# Altium footprint library Amirreza.PcbLib: 524 footprints (part 9 of 33)
Each footprint in its own frame and in the unit in brackets; x right, y up, seen from the top. Pads: shape width x height; smd on the part's side, far side on the other; paste and mask are expansions set on the pad; w line width, h text height; cw(c..) or ccw(c..) is an arc to the next point about the centre after c.
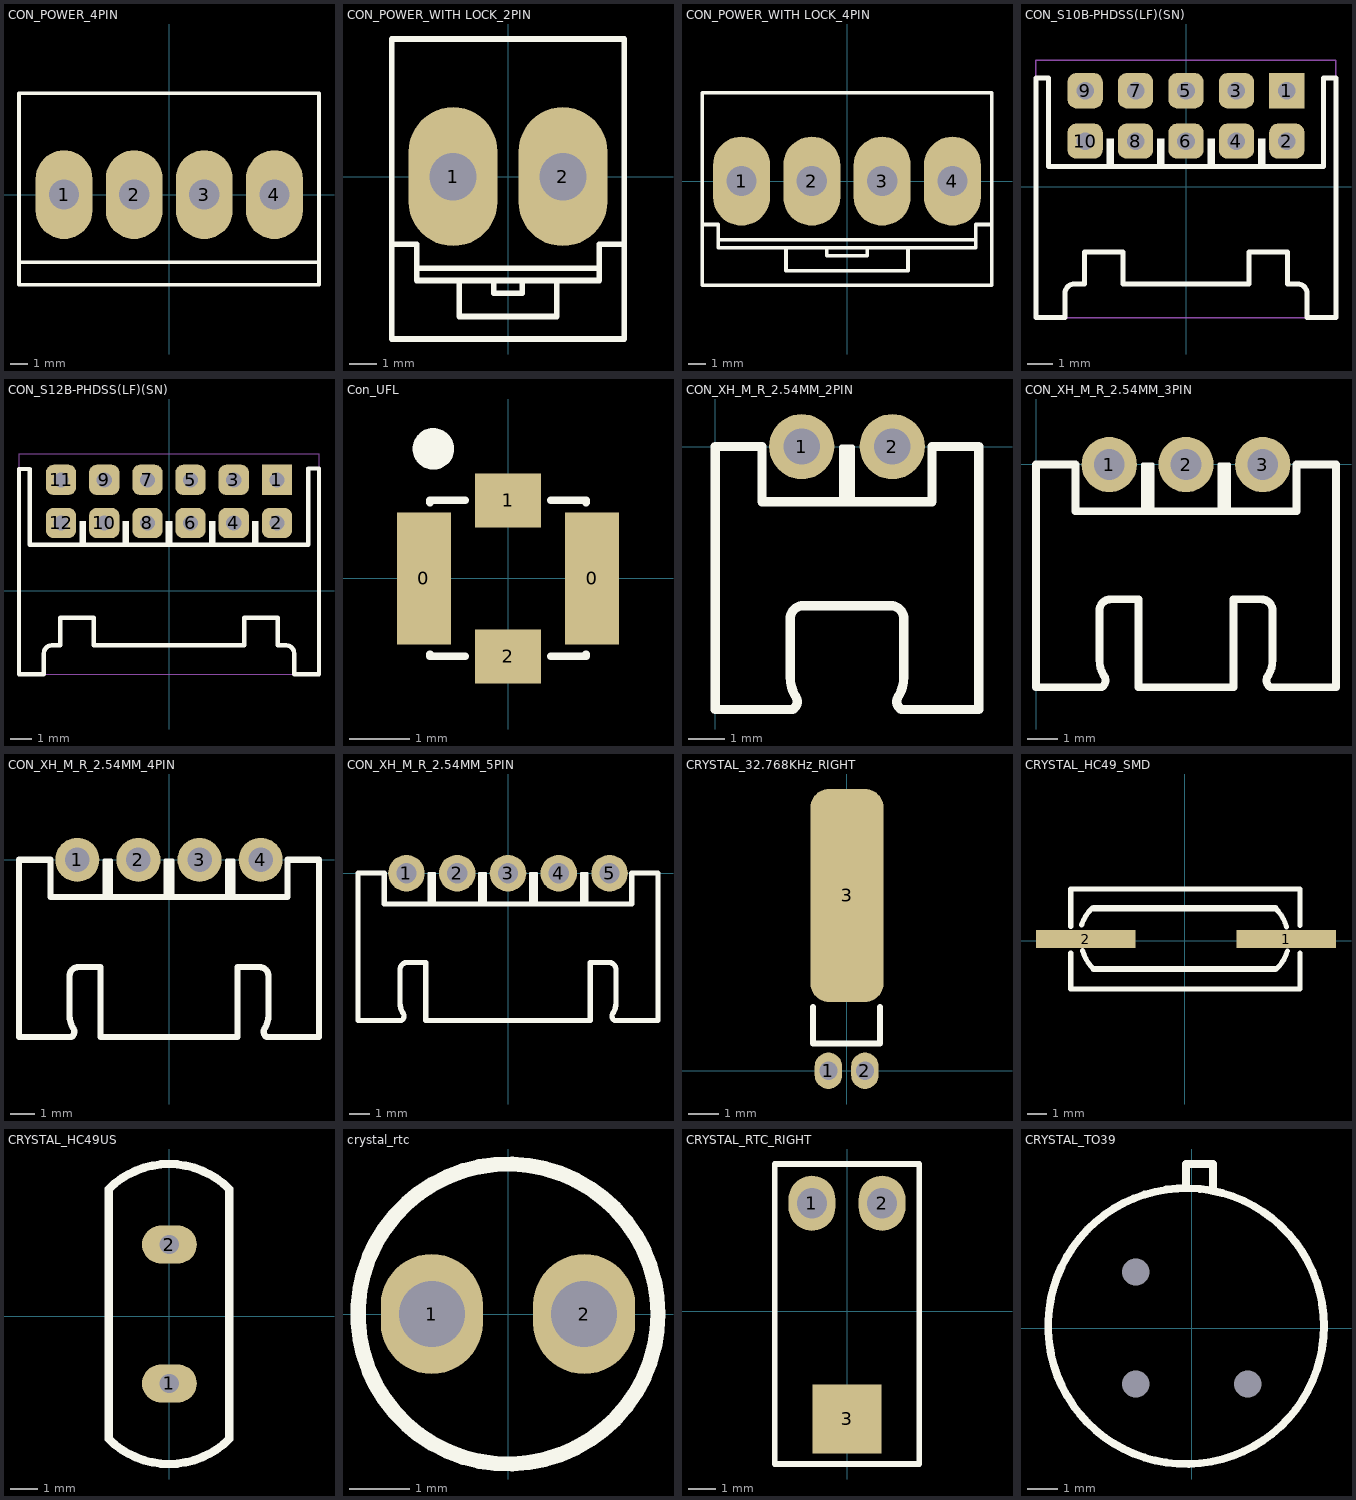
[diagram p8: the footprints below, top view; thin cyan lines are the x and y axes]

## CON_POWER_4PIN [mm]
pads (4):
  oval 3.2x5 hole 1.7: 1(-5.925,0) 2(-1.975,0) 3(1.975,0) 4(5.925,0)
Top Overlay:
  lines w0.203: -8.465,-3.81 8.439,-3.81 ; -8.465,-5.08 8.439,-5.08 8.439,5.715 -8.465,5.715 -8.465,-5.08
3D body "User Library-Cvilux_CI5104P1V00.STEP": height 13.9, standoff -3.6, extent -7.945,-4.978 7.895,4.623

## CON_POWER_WITH LOCK_2PIN [mm]
pads (2):
  oval 3.2x5 hole 1.7: 1(-1.975,0) 2(1.975,0)
Top Overlay:
  lines w0.203: -4.178,-2.436 -3.289,-2.436 -3.289,-3.735 3.289,-3.735 3.289,-2.436 4.178,-2.436 ; -3.289,-3.302 3.289,-3.302 ; -1.752,-3.735 -1.752,-5.035 1.752,-5.035 1.752,-3.735 ; -0.514,-3.735 -0.514,-4.191 0.514,-4.191 0.514,-3.735 ; -4.178,-5.842 4.178,-5.842 4.178,4.953 -4.178,4.953 -4.178,-5.842
3D body "User Library-Power 2 - 3_96 pitch_Straight.step": height 16.61, standoff -3.61, extent -3.945,-5.724 3.975,4.796

## CON_POWER_WITH LOCK_4PIN [mm]
pads (4):
  oval 3.2x5 hole 1.7: 1(-5.925,0) 2(-1.975,0) 3(1.975,0) 4(5.925,0)
Top Overlay:
  lines w0.203: -8.128,-2.436 -7.239,-2.436 -7.239,-3.735 7.239,-3.735 7.239,-2.436 8.128,-2.436 ; -7.239,-3.302 7.239,-3.302 ; -3.429,-3.735 -3.429,-5.035 3.429,-5.035 3.429,-3.735 ; -1.143,-3.735 -1.143,-4.191 1.143,-4.191 1.143,-3.735 ; -8.128,-5.842 8.128,-5.842 8.128,4.953 -8.128,4.953 -8.128,-5.842
3D body "User Library-Power 4 - 3_96 pitch_Straight.step": height 16.58, standoff -3.64, extent -7.92,-5.706 7.92,4.814

## CON_S10B-PHDSS(LF)(SN) [mm]
pads (10):
  rect 1.4x1.4 hole 0.7: 1(3.981,3.818)
  rrect50% 1.4x1.4 hole 0.7: 2(3.981,1.818) 3(1.981,3.818) 4(1.981,1.818) 5(-0.019,3.818) 6(-0.019,1.818) 7(-2.019,3.818) 8(-2.019,1.818) 9(-4.019,3.818) 10(-4.019,1.818)
Top Overlay:
  rectangle: -3.171,0.849 -2.867,1.92
  rectangle: -1.171,0.849 -0.867,1.92
  rectangle: 0.829,0.849 1.133,1.92
  rectangle: 2.829,0.849 3.133,1.92
  lines w0.203: -5.969,-5.182 -5.969,4.318 -5.469,4.318 -5.469,0.818 5.431,0.818 5.431,4.318 5.931,4.318 5.931,-5.182 4.778,-5.182 4.778,-4.217 ccw(c4.413,-4.217) 4.413,-3.852 4.014,-3.852 4.014,-2.582 2.476,-2.582 2.476,-3.852 -2.514,-3.852 -2.514,-2.582 -4.052,-2.582 -4.052,-3.852 -4.451,-3.852 ccw(c-4.451,-4.217) -4.816,-4.217 -4.816,-5.182 -5.969,-5.182
Mechanical 13:
  lines w0.05: -5.969,-5.182 -5.969,5.018 ; -5.969,-5.182 -5.969,5.018 ; -5.969,-5.182 5.931,-5.182 ; -5.969,-5.182 5.931,-5.182 ; -5.969,5.018 5.931,5.018 ; -5.969,5.018 5.931,5.018 ; 5.931,-5.182 5.931,5.018 ; 5.931,-5.182 5.931,5.018
3D body "User Library-JST - S10B-PHDSS (PHD SERIES - 2_0mm PITCH WIRE-TO-BOARD, TH, RA (SIDE ENTRY), GF NYLON).step": height 5.05, standoff -2.95, extent -5.969,-5.207 5.931,4.293

## CON_S12B-PHDSS(LF)(SN) [mm]
pads (12):
  rect 1.4x1.4 hole 0.7: 1(4.984,5.139)
  rrect50% 1.4x1.4 hole 0.7: 2(4.984,3.139) 3(2.984,5.139) 4(2.984,3.139) 5(0.984,5.139) 6(0.984,3.139) 7(-1.016,5.139) 8(-1.016,3.139) 9(-3.016,5.139) 10(-3.016,3.139) 11(-5.016,5.139) 12(-5.016,3.139)
Top Overlay:
  rectangle: -4.168,2.171 -3.864,3.242
  rectangle: -2.168,2.171 -1.864,3.242
  rectangle: -0.168,2.171 0.136,3.242
  rectangle: 3.832,2.171 4.136,3.242
  rectangle: 1.832,2.171 2.136,3.242
  lines w0.203: 6.434,2.139 -6.466,2.139 -6.466,5.639 -6.966,5.639 -6.966,-3.861 -5.813,-3.861 -5.813,-2.896 cw(c-5.448,-2.896) -5.448,-2.53 -5.049,-2.53 -5.049,-1.26 -3.511,-1.26 -3.511,-2.53 3.479,-2.53 3.479,-1.26 5.017,-1.26 5.017,-2.53 5.416,-2.53 cw(c5.416,-2.896) 5.781,-2.896 5.781,-3.861 6.934,-3.861 6.934,5.639 ; 6.434,2.164 6.434,5.664 6.934,5.664
Mechanical 13:
  lines w0.05: 4.934,-3.861 -6.966,-3.861 ; 4.934,6.339 -6.966,6.339 ; -6.966,-3.861 -6.966,6.339 ; -6.966,-3.861 -6.966,6.339 ; -6.966,-3.861 6.934,-3.861 6.934,6.339 -6.966,6.339
3D body "User Library-JST - S10B-PHDSS (PHD SERIES - 2_0mm PITCH WIRE-TO-BOARD, TH, RA (SIDE ENTRY), GF NYLON).step": height 5.05, standoff -2.95, extent -4.966,-3.861 6.934,5.639

## Con_UFL [mm]
pads (4):
  rect 0.9x2.2 smd: 0(-1.4,0) 0(1.4,0)
  rect 1.1x0.9 smd: 1(0,1.3) 2(0,-1.3)
Top Overlay:
  circle w0.35: c-1.245,2.159 r0.17
  lines w0.127: -1.3,-1.264 -1.3,-1.3 -0.716,-1.3 ; -1.3,1.264 -1.3,1.3 -0.716,1.3 ; 0.716,-1.3 1.3,-1.3 1.3,-1.264 ; 0.716,1.3 1.3,1.3 1.3,1.264
3D body "User Library-20279-001.step": height 1.25, standoff -0.01, extent -1.5,-1.55 1.5,1.55

## CON_XH_M_R_2.54MM_2PIN [mm]
pads (2):
  round 1.8 / inner round 1.8 / far side rect 1.8x2.5 hole 1: 1(2.387,-0.003)
  round 1.8 / inner round 1.8 / far side rrect50% 1.8x2.5 hole 1: 2(4.887,-0.003)
Top Overlay:
  rectangle: 3.484,-1.527 3.789,-0.003
  lines w0.127: 3.789,-1.527 3.789,-0.003 3.484,-0.003 ; 3.484,-0.003 3.484,-1.527 3.484,-0.003
  lines w0.254: 7.273,-7.257 5.136,-7.257 cw(c5.263,-7.037) 5.069,-6.873 ccw(c4.189,-6.365) 5.205,-6.365 5.205,-4.757 ccw(c4.84,-4.757) 4.84,-4.392 3.936,-4.392 2.434,-4.392 ccw(c2.434,-4.757) 2.068,-4.757 2.068,-6.365 ccw(c3.084,-6.365) 2.204,-6.873 cw(c2.01,-7.037) 2.137,-7.257 0,-7.257 0,-7.254 0,0 1.289,0 1.289,-1.527 3.789,-1.527 5.984,-1.527 5.984,0 7.273,0 7.273,-7.254
3D body "User Library-JST-XH-2_5mm-2.STEP": height 5.95, standoff -3.35, extent -0.112,-7.256 7.388,0.384

## CON_XH_M_R_2.54MM_3PIN [mm]
pads (3):
  round 1.8 / inner round 1.8 / far side rect 1.8x2.5 hole 1: 1(2.387,-0.003)
  round 1.8 / inner round 1.8 / far side rrect50% 1.8x2.5 hole 1: 2(4.887,-0.003) 3(7.387,-0.003)
Top Overlay:
  rectangle: 3.484,-1.527 3.789,-0.003
  rectangle: 5.984,-1.527 6.289,-0.003
  lines w0.127: 3.484,-1.527 3.484,-0.003 3.789,-0.003 3.789,-1.527 ; 5.984,-1.527 5.984,-0.003 6.289,-0.003 6.289,-1.527
  lines w0.254: 9.773,-7.257 7.636,-7.257 cw(c7.763,-7.037) 7.569,-6.873 ccw(c6.689,-6.365) 7.705,-6.365 7.705,-4.757 ccw(c7.34,-4.757) 7.34,-4.392 6.436,-4.392 6.436,-7.257 3.337,-7.257 3.337,-4.392 2.434,-4.392 ccw(c2.434,-4.757) 2.068,-4.757 2.068,-6.365 ccw(c3.084,-6.365) 2.204,-6.873 cw(c2.01,-7.037) 2.137,-7.257 0,-7.257 0,-7.254 0,0 1.289,0 1.289,-1.527 3.789,-1.527 6.289,-1.527 8.484,-1.527 8.484,0 9.773,0 9.773,-7.254
3D body "User Library-JST-XH-2_5mm-3.STEP": height 5.95, standoff -3.35, extent -0.112,-7.256 9.888,0.384

## CON_XH_M_R_2.54MM_4PIN [mm]
pads (4):
  round 1.8 / inner round 1.8 / far side rect 1.8x2.5 hole 1: 1(-3.75,0)
  round 1.8 / inner round 1.8 / far side rrect50% 1.8x2.5 hole 1: 2(-1.25,0) 3(1.25,0) 4(3.75,0)
Top Overlay:
  rectangle: 2.348,-1.524 2.652,0
  rectangle: -0.152,-1.524 0.152,0
  rectangle: -2.652,-1.524 -2.348,0
  lines w0.127: -2.652,-1.524 -2.652,0 -2.348,0 -2.348,-1.524 ; -0.152,-1.524 -0.152,0 0.152,0 0.152,-1.524 ; 2.348,-1.524 2.348,0 2.652,0 2.652,-1.524
  lines w0.254: -2.348,-1.524 0.152,-1.524 2.652,-1.524 4.848,-1.524 4.848,0.003 6.137,0.003 6.137,-7.251 ; -2.348,-1.524 -4.848,-1.524 -4.848,0.003 -6.137,0.003 -6.137,-7.251 -6.137,-7.254 -4,-7.254 ccw(c-4.127,-7.034) -3.932,-6.871 cw(c-3.053,-6.363) -4.069,-6.363 -4.069,-4.755 cw(c-3.703,-4.755) -3.703,-4.389 -2.8,-4.389 -2.8,-7.254 2.8,-7.254 2.8,-4.389 3.703,-4.389 cw(c3.703,-4.755) 4.069,-4.755 4.069,-6.363 cw(c3.053,-6.363) 3.932,-6.871 ccw(c4.127,-7.034) 4,-7.254 6.137,-7.254
3D body "User Library-JST-XH-2_5mm-4.step": height 5.97, standoff -3.33, extent -6.248,-7.254 6.252,0.386

## CON_XH_M_R_2.54MM_5PIN [mm]
pads (5):
  round 1.8 / inner round 1.8 / far side rect 1.8x2.5 hole 1: 1(-5,0)
  round 1.8 / inner round 1.8 / far side rrect50% 1.8x2.5 hole 1: 2(-2.5,0) 3(0,0) 4(2.5,0) 5(5,0)
Top Overlay:
  rectangle: -3.902,-1.524 -3.598,0
  rectangle: -1.402,-1.524 -1.098,0
  rectangle: 3.598,-1.524 3.902,0
  rectangle: 1.098,-1.524 1.402,0
  lines w0.127: -3.902,-1.524 -3.902,0 -3.598,0 -3.598,-1.524 ; -1.402,-1.524 -1.402,0 -1.098,0 -1.098,-1.524 ; 1.098,-1.524 1.098,0 1.402,0 1.402,-1.524 ; 3.598,-1.524 3.598,0 3.902,0 3.902,-1.524
  lines w0.254: 7.387,-7.254 5.25,-7.254 cw(c5.377,-7.034) 5.182,-6.871 ccw(c4.303,-6.363) 5.319,-6.363 5.319,-4.755 ccw(c4.953,-4.755) 4.953,-4.389 4.05,-4.389 4.05,-7.254 -4.05,-7.254 -4.05,-4.389 -4.953,-4.389 ccw(c-4.953,-4.755) -5.319,-4.755 -5.319,-6.363 ccw(c-4.303,-6.363) -5.182,-6.871 cw(c-5.377,-7.034) -5.25,-7.254 -7.387,-7.254 -7.387,-7.251 -7.387,0.003 -6.098,0.003 -6.098,-1.524 -3.598,-1.524 -1.098,-1.524 1.402,-1.524 6.098,-1.524 6.098,0.003 7.387,0.003 7.387,-7.251
3D body "User Library-JST-XH-2_5mm-5.STEP": height 5.95, standoff -3.35, extent -7.498,-7.254 7.502,0.386

## CRYSTAL_32.768KHz_RIGHT [mm] "CRYSTAL RTC SLEEP, AB26T"
height 2.3
pads (3):
  oval 0.9x1.2 hole 0.6 mask+0.1: 1(-0.6,0) 2(0.6,0)
  rrect50% 2.4x7 smd: 3(0.011,5.763)
Top Overlay:
  lines w0.2: -1.1,2.1 -1.1,0.9 1.1,0.9 1.1,2.1
3D body "User Library-DT-26-1.step": height 2, standoff -2, extent -1,-0.1 1,7.04

## CRYSTAL_HC49_SMD [mm]
pads (2):
  rect 5x0.9 smd: 1(5.084,0.08) 2(-4.975,0.08)
Top Overlay:
  lines w0.254: -5.731,-0.617 -5.731,-2.42 5.769,-2.42 5.769,-0.617 ; -5.731,0.7 -5.731,2.58 5.769,2.58 5.769,0.751 ; -5.194,0.773 cw(c-3.146,0.1) -4.67,1.624 ; -5.138,-0.501 ccw(c-3.068,0.1) -4.592,-1.424 ; 4.552,1.624 cw(c3.028,0.1) 5.102,0.685 ; 4.601,-1.424 ccw(c3.077,0.1) 5.139,-0.526
  lines w0.305: -4.592,-1.424 4.552,-1.424 ; -4.592,1.624 4.552,1.624
3D body "User Library-Precision_CSM-7.step": height 4.5, standoff -0.05, extent -6.4,-2.5 6.4,2.5

## CRYSTAL_HC49US [mm]
pads (2):
  oval 2x1.4 hole 0.711: 1(0.016,-2.462) 2(0.016,2.618)
Top Overlay:
  lines w0.305: -2.2,-4.494 ccw(c0,-2.294) 2.2,-4.494 2.2,4.65 ccw(c0,2.45) -2.2,4.65 -2.2,-4.494
3D body "User Library-HC49S-1.STEP": height 3.6, standoff -3, extent -2.256,-5.49 2.235,5.49

## crystal_rtc [mm]
pads (2):
  oval 1.7x2 hole 1.1: 1(-1.27,0) 2(1.27,0)
Top Overlay:
  circle w0.254: c0,0 r2.5
3D body "User Library-Crystal TH.step": height 8.98, standoff -1.8, extent -1.725,-1.6 1.725,1.6

## CRYSTAL_RTC_RIGHT [mm]
pads (3):
  oval 1.7x2 hole 1.1: 1(-1.27,3.906) 2(1.27,3.906)
  rect 2.5x2.5 smd paste+0 mask+0: 3(0,-3.906)
Top Overlay:
  lines w0.2: -2.616,-5.543 0,-5.543 2.616,-5.543 2.616,5.328 0,5.328 -2.616,5.328 -2.616,-5.543
Mechanical 13:
  lines w0.2: -1,-4.231 1,-4.231
3D body "Crys_Citizen_Finedevice_CMR200T32768DZYT_eec.STEP": height 0.25, standoff 0, extent -1.85,-5.256 1.85,5.194

## CRYSTAL_TO39 [mil]
pads (3):
  round 0 / inner round 0 / far side round 98.43 hole 35.43: 1(-72.5,72.5) 2(-72.5,-72.5) 3(72.5,-72.5)
Top Overlay:
  circle w10: c-7.5,2.5 r178.68
  lines w10: -7.5,182.5 -7.5,212.5 27.5,212.5 27.5,182.5
3D body "User Library-TO-39_TO-205AD.step": height 263.78, standoff -461.42, extent -261.6,-261.68 261.69,261.61